# Altium schematic symbol library Sang_library.SchLib: 1607 symbols (part 2 of 15)
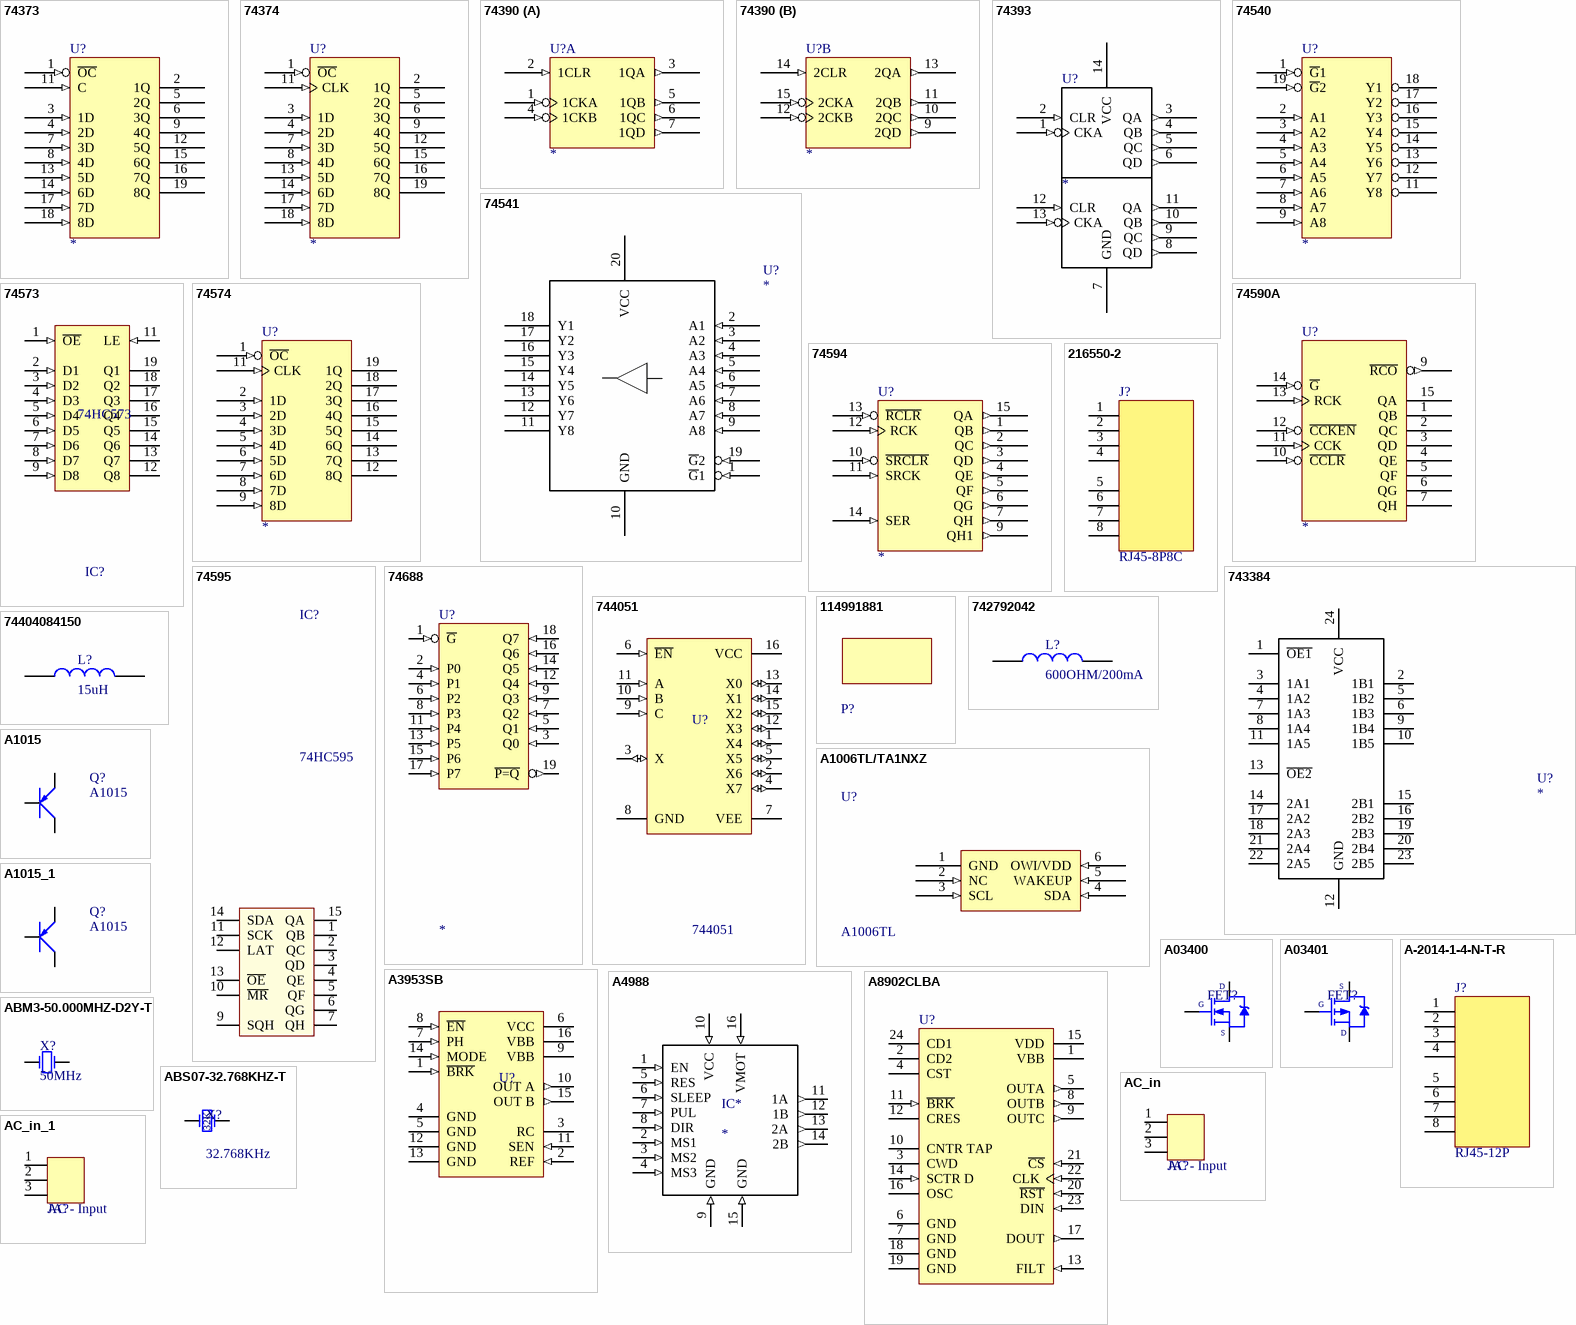
[diagram p99: symbols 74373 to AC_in_1]

## 743384
designator U?
74CB3T3384 LEVEL SHIFTING BUFFER
footprint SO24
pins: 1 ~{OE1}, 2 1B1, 3 1A1, 4 1A2, 5 1B2, 6 1B3, 7 1A3, 8 1A4, 9 1B4, 10 1B5, 11 1A5, 12 GND, 13 ~{OE2}, 14 2A1, 15 2B1, 16 2B2, 17 2A2, 18 2A3, 19 2B3, 20 2B4, 21 2A4, 22 2A5, 23 2B5, 24 VCC

## 744051
designator U?
Analog Multiplexer/Demultiplexer; Published: 17-Jul-2002; LatestRevisionDate: 06-Jun-2005; LatestRevisionNote: Stylized 3D Model Added; DatasheetVersion: Mar-2000; PackageReference: 648-08; Publisher: Altium Limited; PackageDescription: DIP; 16 Leads; Row Spacing 7.62 mm; Pitch 2.54 mm; Code_JEDEC: MS-001-BB; ComponentLink1Description: Manufacturer Link; ComponentLink1URL: http://www.onsemi.com/site/products/parametrics/0,4446,47,00.html; ComponentLink2Description: Datasheet; ComponentLink2URL: http://www.onsemi.com/pub/Collateral/MC74HC4051A-D.PDF
footprint DIP16
footprint SO16
pins: 1 X4 (io), 2 X6 (io), 3 X (io), 4 X7 (io), 5 X5 (io), 6 ~{EN} (in), 7 VEE (power), 8 GND (power), 9 C (in), 10 B (in), 11 A (in), 12 X3 (io), 13 X0 (io), 14 X1 (io), 15 X2 (io), 16 VCC (power)

## 114991881
designator P?  (value not drawn)
OV2640 FISHEYE CAMERA; MFR: Seeed Technology Co., Ltd; Value: 114991881; MPN: 114991881; MFR_URL: *
footprint SEEED_OV2640_CAM (Footprint not found)

## 742792042
designator L?, comment 600OHM/200mA
IND-FERRITE BEAD 600 OHM 1LN 0805; MPN: 742792042; CompanyID: VT-01115; Solder: SMT; Value: 600OHM/200mA; Category: FERRITE BEAD; PinCount: 2
footprint IND-0805 (2012) (Resistor, Chip; 2.00 mm L X 1.25 mm W X 0.70 mm H body)
pins: 1, 2

## 74404084150
designator L?, comment 15uH
FIXED IND 15UH 2.6A 47 MOHM SMD; MPN: 74404084150; MFR: Würth Elektronik; Solder: SMT; Value: 15uH; Category: INDUCTOR; PinCount: 2
footprint IND-8x8mm
pins: 1, 2

## A1006TL/TA1NXZ
designator U?, comment A1006TL
IC SECURE AUTHENTICATOR 6HXSON; MPN: A1006TL/TA1NXZ; MFR: NXP USA Inc.; Solder: SMT; Value: A1006TL; Category: IC; PinCount: 6
footprint 6-HXSON (SON, 6-Leads, Body 2.00x2.00mm, Pitch 0.65mm, Thermal Pad 1.60x1.00mm, IPC Medium Density)
pins: 1 GND, 2 NC (in), 3 SCL (in), 4 SDA (in), 5 WAKEUP (in), 6 OWI/VDD (in)

## A1015
designator Q?
Dán; Ten_Linh_Kien: A1015 SOT23 TRANS PNP 0.15A 50V ( SMD-BA); Don_Vi: Con; Ma_Hang: MH001957; Ghi_Chu: *; Kieu_Chan: *; Chung_Loai: Dán
footprint QTO-92 (TO-92)
footprint SOT23B (SOT 23B)
pins: 1 B, 2 C, 3 E

## A1015_1
designator Q?, comment A1015
Dán; Ten_Linh_Kien: A1015 SOT23 TRANS PNP 0.15A 50V ( SMD-BA); Don_Vi: Con; Ma_Hang: MH001957; Ghi_Chu: *; Kieu_Chan: *; Chung_Loai: Dán
footprint QTO-92 (TO-92)
footprint SOT23B (SOT 23B)
pins: 1 B, 2 C, 3 E

## A03400
designator FET?  (value not drawn)
N-MOS 30V 5.8A
footprint SOT23-123 (SOT23, 1=bottom-left, 2=top, 3=bottom-right)
pins: 1 G, 2 D, 3 S

## A03401
designator FET?  (value not drawn)
P-MOS 30V 4A
footprint SOT23-123 (SOT23, 1=bottom-left, 2=top, 3=bottom-right)
pins: 1 G, 2 D, 3 S

## A3953SB
designator U?
Full-Bridge PWM Motor Driver; Note: Pins (4,5) and (12,13) exist as TABS; all are internally connected (GND).; Published: 13-Oct-2000; LatestRevisionDate: 06-Jun-2005; LatestRevisionNote: Stylized 3D Model Added.; DatasheetVersion: 1995; PackageVersion: 1994; PackageReference: B16; Publisher: Altium Limited; PackageDescription: DIP; 16 Leads; Row Spacing 7.62 mm; Pitch 2.54 mm; Code_JEDEC: MS-001-BB; ComponentLink1Description: Manufacturer Link; ComponentLink1URL: http://www.allegromicro.com/; ComponentLink2Description: Datasheet; ComponentLink2URL: http://www.allegromicro.com/sf/3953/
footprint DIP16
footprint SO16L (SOIC, 16-Leads, Body 10.30x7.50mm, Pitch 1.27mm, IPC Medium Density)
pins: 1 ~{BRK} (in), 2 REF (in), 3 RC, 4 GND (power), 5 GND (power), 6 VCC (power), 7 PH (in), 8 ~{EN} (in), 9 VBB (power), 10 OUT A (out), 11 SEN (in), 12 GND (power), 13 GND (power), 14 MODE (in), 15 OUT B (out), 16 VBB (power)

## A4988
designator IC*
footprint A4988
footprint A4988
pins: 1 EN (in), 2 MS1 (in), 3 MS2 (in), 4 MS3 (in), 5 RES (in), 6 SLEEP (in), 7 PUL (in), 8 DIR (in), 9 GND (in), 10 VCC (in), 11 1A (out), 12 1B (out), 13 2A (out), 14 2B (out), 15 GND (in), 16 VMOT (in)

## A8902CLBA
designator U?
3-Phase Brushless DC Motor Controller/Driver with Back-EMF Sensing; Note: Pins (6,7) and (18,19) exist as TABS; all are internally connected (GND).; ComponentAvailability: Obsolete; Published: 13-Oct-2000; LatestRevisionDate: 13-Apr-2006; LatestRevisionNote: IPC-7351 Footprint Added.; DatasheetVersion: 1995; PackageVersion: 1995; PackageReference: LB24; Publisher: Altium Limited; PackageDescription: 24-Pin Small Outline Integrated Circuit 1.27 mm Pitch; ComponentLink1Description: Manufacturer Link; ComponentLink1URL: http://www.allegromicro.com/; ComponentLink2Description: Datasheet; ComponentLink2URL: http://www.allegromicro.com/datafile/archive/89027.pdf
footprint SO24 (SOIC, 24-Leads, Body 15.30x7.50mm, Pitch 1.27mm, IPC Medium Density)
pins: 1 VBB (power), 2 CD2, 3 CWD, 4 CST, 5 OUTA (out), 6 GND (power), 7 GND (power), 8 OUTB (out), 9 OUTC (out), 10 CNTR TAP, 11 ~{BRK} (in), 12 CRES, 13 FILT (in), 14 SCTR D (in), 15 VDD (power), 16 OSC, 17 DOUT (out), 18 GND (power), 19 GND (power), 20 ~{RST} (in), 21 ~{CS} (in), 22 CLK (in), 23 DIN (in), 24 CD1

## A-2014-1-4-N-T-R
designator J?, comment RJ45-12P
Solder: WAVE
footprint A-2014-1-4-N-T-R (Footprint not found)
pins: 1, 2, 3, 4, 5, 6, 7, 8

## ABM3-50.000MHZ-D2Y-T
designator X?, comment 50MHz
CRYSTAL 50.0000MHZ 18pF SMD; MPN: ABM3-50.000MHZ-D2Y-T; MFR: Abracon LLC; Solder: SMT; Value: 50MHz; Category: CRYSTAL
footprint CRYSTAL_ABM3 5x3.2mm (Crystal 5x3.2mm)
pins: 1 OSC1, 2 OSC2

## ABS07-32.768KHZ-T
designator X?, comment 32.768KHz
CRYSTAL 32.7680KHZ 12.5pF SMD; MPN: ABS07-32.768KHZ-T; Solder: SMT; CompanyID: VT-01153; Value: 32.768KHz; Category: CRYSTAL
footprint Crystal_ABS07_SMD-3.2x1.5MM
pins: 1 OSC1, 2 OSC2
text: 32K

## AC_in
designator JA?, comment AC - Input
Value: AC - Input
footprint AC_IN (AC_Input)
pins: 1, 2, 3

## AC_in_1
designator JA?, comment AC - Input
Value: AC - Input
footprint AC_IN (AC_Input)
pins: 1, 2, 3

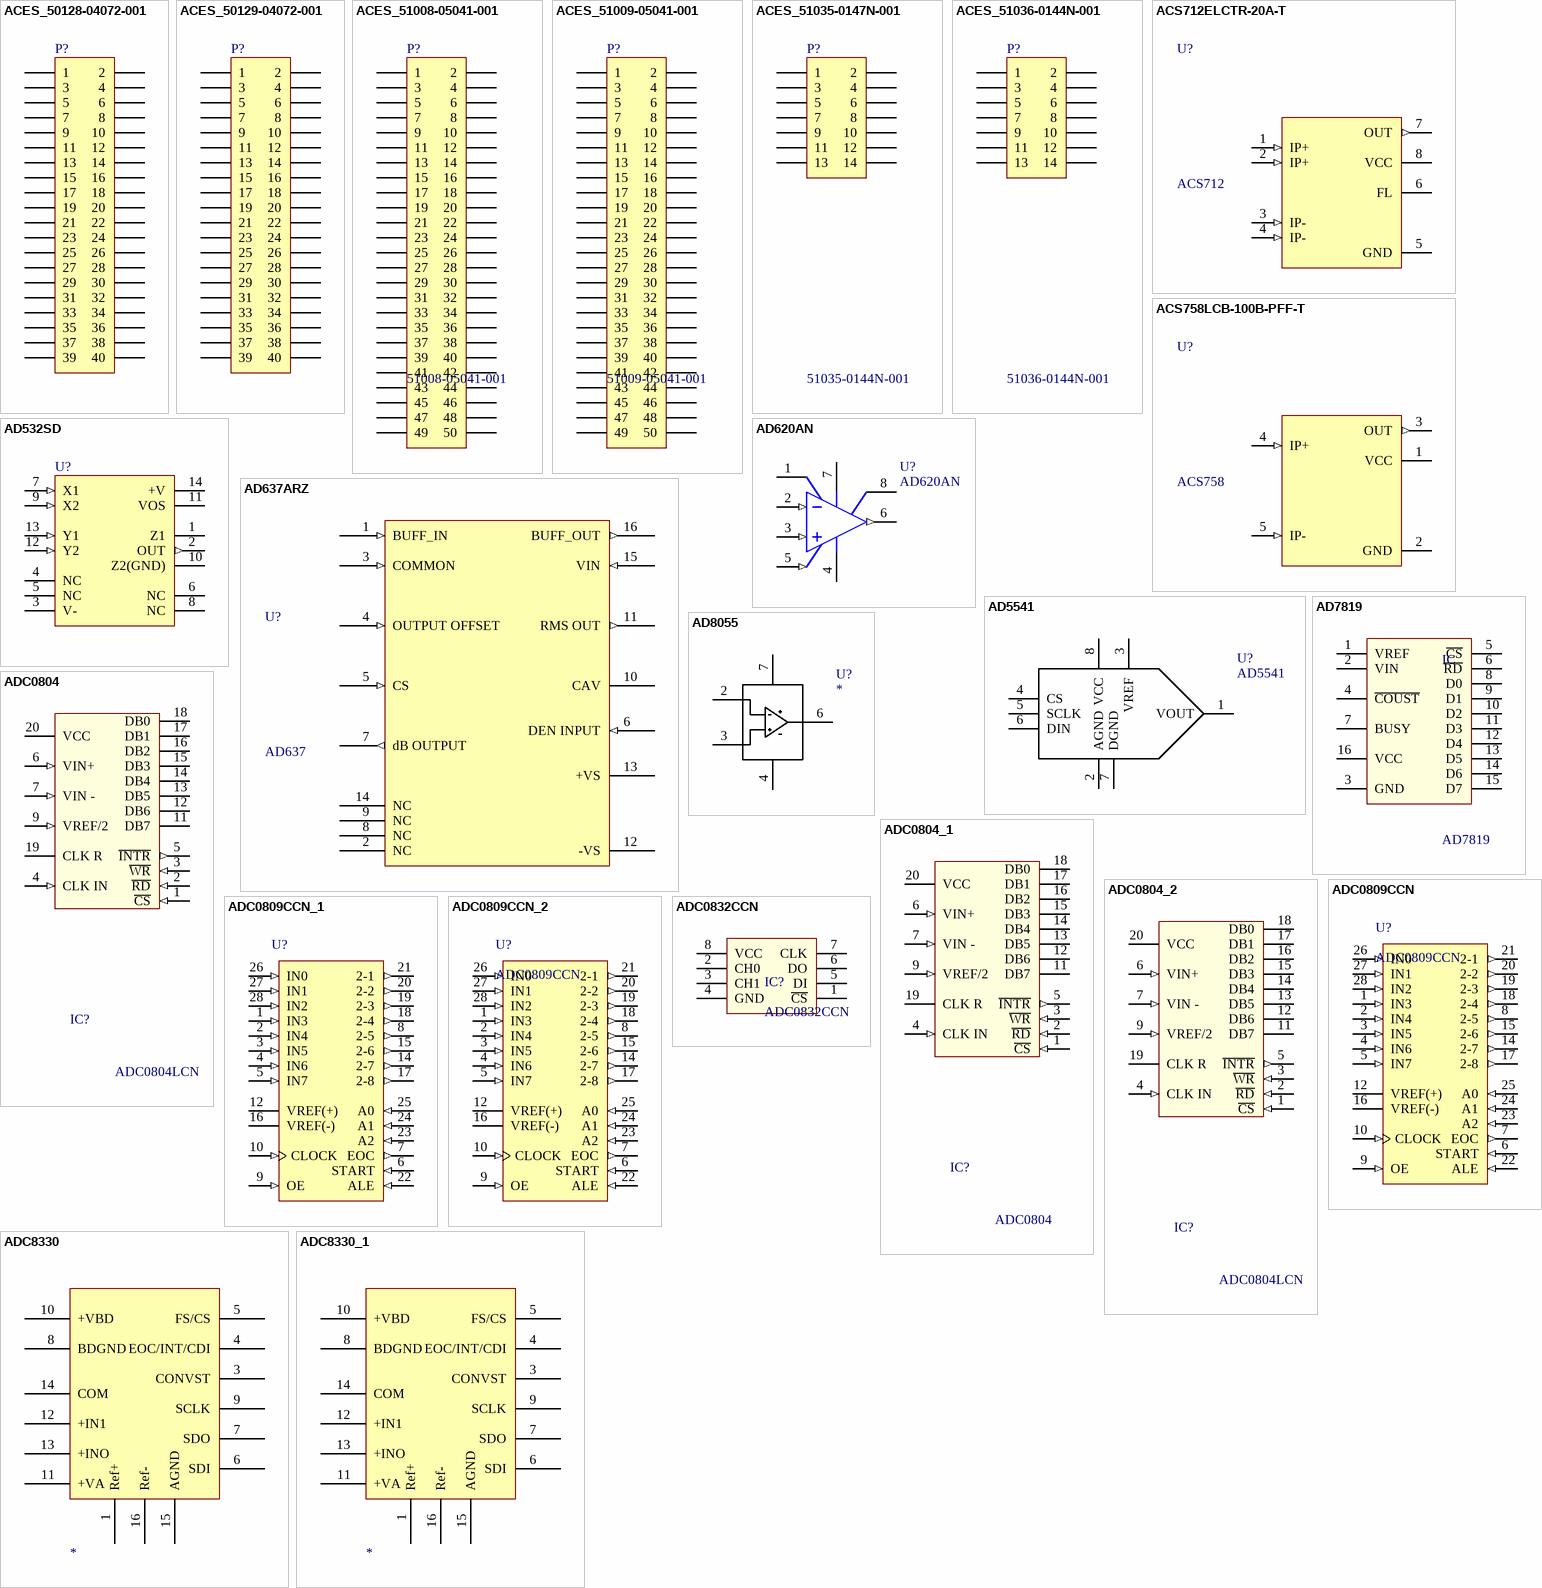
[diagram p7: symbols ACES_50128-04072-001 to ADC8330_1]

## ACES_50128-04072-001
designator P?
50128-04072-001 Dual Row, 40 pin, MALE; MFR: ACES; Solder: SMT; MPN: 50128-04072-001; Value: 50128-04072-001
footprint ACES_50128-04072-001 (Footprint not found)
signal-integrity model Connector
pins: 1, 2, 3, 4, 5, 6, 7, 8, 9, 10, 11, 12, 13, 14, 15, 16, 17, 18, 19, 20, 21, 22, 23, 24, 25, 26, 27, 28, 29, 30, 31, 32, 33, 34, 35, 36, 37, 38, 39, 40

## ACES_50129-04072-001
designator P?
50129-04072-001 Dual Row, 40 pin, FEMALE; MFR: ACES; Solder: SMT; MPN: 50129-04072-001; Value: 50129-04072-001
footprint ACES_50129-04072-001 (Footprint not found)
signal-integrity model Connector
pins: 1, 2, 3, 4, 5, 6, 7, 8, 9, 10, 11, 12, 13, 14, 15, 16, 17, 18, 19, 20, 21, 22, 23, 24, 25, 26, 27, 28, 29, 30, 31, 32, 33, 34, 35, 36, 37, 38, 39, 40

## ACES_51008-05041-001
designator P?, comment 51008-05041-001
51008-05041-001 Dual Row, 50 pin, MALE; MFR: ACES; MPN: ACES_51008-05041-001; Solder: SMT; Value: ACES_51008-05041-001; MPN2: 10132798-052100LF; MFR2: Amphenol ICC (FCI)
footprint ACES_51008-05041-001 (Footprint not found)
signal-integrity model Connector
pins: 1, 2, 3, 4, 5, 6, 7, 8, 9, 10, 11, 12, 13, 14, 15, 16, 17, 18, 19, 20, 21, 22, 23, 24, 25, 26, 27, 28, 29, 30, 31, 32, 33, 34, 35, 36, 37, 38, 39, 40, 41, 42, 43, 44, 45, 46, 47, 48, 49, 50

## ACES_51009-05041-001
designator P?, comment 51009-05041-001
51009-05041-001 Dual Row, 50 pin, FEMALE; MFR: ACES; MPN: ACES_51009-05041-001; Solder: SMT; MPN2: 10132797-055100LF; MFR2: Amphenol ICC (FCI)
footprint ACES_51009-05041-001
signal-integrity model Connector
pins: 1, 2, 3, 4, 5, 6, 7, 8, 9, 10, 11, 12, 13, 14, 15, 16, 17, 18, 19, 20, 21, 22, 23, 24, 25, 26, 27, 28, 29, 30, 31, 32, 33, 34, 35, 36, 37, 38, 39, 40, 41, 42, 43, 44, 45, 46, 47, 48, 49, 50

## ACES_51035-0147N-001
designator P?, comment 51035-0144N-001
51035-0147N-001 Dual Row, 14 pin, MALE; MFR: ACES; Solder: SMT; MPN: 51035-0147N-001; Value: 51035-0147N-001
footprint ACES_51035-0147N-001 (Footprint not found)
signal-integrity model Connector
pins: 1, 2, 3, 4, 5, 6, 7, 8, 9, 10, 11, 12, 13, 14

## ACES_51036-0144N-001
designator P?, comment 51036-0144N-001
51036-0144N-001 Dual Row, 14 pin, FEMALE; MFR: ACES; Solder: SMT; MPN: 51036-0144N-001; Value: 51036-0144N-001
footprint ACES_51036-0144N-001 (Footprint not found)
signal-integrity model Connector
pins: 1, 2, 3, 4, 5, 6, 7, 8, 9, 10, 11, 12, 13, 14

## ACS712ELCTR-20A-T
designator U?, comment ACS712
SENSOR CURRENT HALL 20A AC/DC; MPN: ACS712ELCTR-20A-T; MFR: Allegro; Solder: SMT; Value: ACS712; Category: IC; PinCount: 8
footprint SOIC-8
pins: 1 IP+ (in), 2 IP+ (in), 3 IP- (in), 4 IP- (in), 5 GND, 6 FL, 7 OUT (out), 8 VCC

## ACS758LCB-100B-PFF-T
designator U?, comment ACS758
SENSOR CURRENT HALL 100A AC/DC; MPN: ACS758LCB-100B-PFF-T; MFR: Allegro MicroSystems; Solder: SMT; Value: ACS758; Category: IC; PinCount: 5
footprint ACS758LCB (Footprint not found)
pins: 1 VCC, 2 GND, 3 OUT (out), 4 IP+ (in), 5 IP- (in)

## AD532SD
designator U?
Internally Trimmed IC Multiplier; Note: Pins 4, 5, 6 and 8 are not connected; Published: 8-Jun-2000; LatestRevisionDate: 04-Mar-2005; LatestRevisionNote: Stylized 3D Model Added.; DatasheetVersion: REV.A 1996; PackageReference: D-14; Publisher: Altium Limited; PackageDescription: DIP; 14 Leads; Row Spacing 7.62 mm; Pitch 2.54 mm; ComponentLink1Description: Manufacturer Link; ComponentLink1URL: http://www.analog.com/en/prod/0%2C2877%2CAD532%2C00.html; ComponentLink2Description: Datasheet; ComponentLink2URL: http://www.analog.com/UploadedFiles/Data_Sheets/417213471AD532_c.pdf
footprint DIP14
pins: 1 Z1, 2 OUT (out), 3 V- (power), 4 NC, 5 NC, 6 NC, 7 X1 (in), 8 NC, 9 X2 (in), 10 Z2(GND), 11 VOS, 12 Y2 (in), 13 Y1 (in), 14 +V (power)

## AD620AN
designator U?
Low-Cost, Low-Power Instrumentation Amplifier; Published: 8-Jun-2000; LatestRevisionDate: 04-Mar-2005; LatestRevisionNote: Stylized 3D Model Added.; DatasheetVersion: REV.D 1998; PackageVersion: revA; PackageReference: N-8; Publisher: Altium Limited; PackageDescription: DIP; 8 Leads; Row Spacing 7.62 mm; Pitch 2.54 mm; ComponentLink1Description: Manufacturer Link; ComponentLink1URL: http://www.analog.com/en/prod/0%2C2877%2CAD620%2C00.html; ComponentLink2Description: Datasheet; ComponentLink2URL: http://www.analog.com/UploadedFiles/Data_Sheets/897653854AD620_g.pdf
footprint DIP8
footprint SO8 (SOIC, 8-Leads, Body 4.9x3.9mm, Pitch 1.27mm, IPC High Density)
pins: 1 RG, 2 -IN (in), 3 +IN (in), 4 V- (power), 5 REF (in), 6 OUT (out), 7 V+ (power), 8 RG

## AD637ARZ
designator U?, comment AD637
IC RMS TO DC CONVERTER 16SOIC; MPN: AD637ARZ; MFR: Analog Devices Inc.; Solder: SMT; Value: AD637; Category: IC; PinCount: 16
footprint DW16_N (SOIC, 16-Leads, Body 10.3x7.5mm, Pitch 1.27mm, IPC Medium Density)
pins: 1 BUFF_IN (in), 2 NC, 3 COMMON (in), 4 OUTPUT OFFSET (in), 5 CS (in), 6 DEN INPUT (in), 7 dB OUTPUT (out), 8 NC, 9 NC, 10 CAV, 11 RMS OUT (out), 12 -VS (power), 13 +VS (power), 14 NC, 15 VIN (in), 16 BUFF_OUT (out)

## AD5541
designator U?
16 BIT D/A CONVERTOR; Manufacturer Part Number: AD5541JRZ; Manufacturer: Analog Devices Inc; Settling Time: 1µs; Voltage Supply Source: Single Supply; Data Interface: Serial; Number of Bits: 16; Power Dissipation (Max): 6.05mW; Number of Converters: 1; Number of Outputs and Type: 1 Voltage, Unipolar; 1 Voltage, Bipolar; Supplier 1: Digi-Key; Supplier Part Number 1: AD5541JRZ-ND; RoHS: RoHS Compliant; Supplier Part Number: AD5541JRZ-ND; Supplier: Digi-Key; Operating Temperature: 0°C ~ 70°C; Category: Integrated Circuits (ICs); Packaging: Tube; Package / Case: 8-SOIC (3.9mm Width)
footprint DIP8
footprint SO8 (SOIC, 8-Leads, Body 4.9x3.9mm, Pitch 1.27mm, IPC High Density)
pins: 1 VOUT, 2 AGND, 3 VREF, 4 CS, 5 SCLK, 6 DIN, 7 DGND, 8 VCC

## AD7819
designator IC
8 bit A/D  Converter; Value: AD7819
footprint DIP16
footprint SO16 (SOIC, 16-Leads, Body 9.90x3.91mm, Pitch 1.27mm, IPC Medium Density)
pins: 1 VREF, 2 VIN, 3 GND, 4 ~{COUST}, 5 ~{CS}, 6 ~{RD}, 7 BUSY, 8 D0, 9 D1, 10 D2, 11 D3, 12 D4, 13 D5, 14 D6, 15 D7, 16 VCC

## AD8055
designator U?
OPAMP; Manufacturer Part Number: AD8055AR; Manufacturer: Analog Devices Inc; Text Field1: ST; Text Field2: LM2903DT; Text Field3: Avnet; Text Field5: SO8; Text Field6: 0.078; Amplifier Type: Voltage Feedback; Voltage - Input Offset: 3000µV; Current - Output / Channel: 60mA; Current - Supply: 5.4mA; Voltage - Supply, Single/Dual (±): 8 V ~ 12 V, ±4 V ~ 6 V; Number of Circuits: 1; Slew Rate: 1400 V/µs; Current - Input Bias: 400nA; Text Field4: LM2903DT; NI?: *; O?: *; Section:: *; Supplier 1: Digi-Key; Supplier Part Number 1: AD8055AR-ND; Category: Integrated Circuits (ICs); RoHS: RoHS non-compliant; Gain Bandwidth Product: -; Supplier Part Number: AD8055AR-ND; Output Type: -; Operating Temperature: -40°C ~ 125°C; Supplier: Digi-Key; Package / Case: 8-SOIC (3.9mm Width); Packaging: Tube
footprint SO8 (SOIC, 8-Leads, Body 4.9x3.9mm, Pitch 1.27mm, IPC High Density)
footprint DIP8
pins: 2, 3, 4, 6, 7

## ADC0804
designator IC?, comment ADC0804LCN
Cắm; Ten_Linh_Kien: ADC0804LCN DIP20; Don_Vi: Con; Ma_Hang: MH002626; Ghi_Chu: *; Kieu_Chan: *; Chung_Loai: Cắm
footprint DIP20/W0.3 (DIP 20, 20 PIN, W 300mil, Pin to pin 100mil)
pins: 1 ~{CS} (in), 2 ~{RD} (in), 3 ~{WR} (in), 4 CLK IN (in), 5 ~{INTR} (out), 6 VIN+ (in), 7 VIN - (in), 8 AGND (power) hidden to GND, 9 VREF/2 (in), 10 DGND (power) hidden to GND, 11 DB7 (hiz), 12 DB6 (hiz), 13 DB5 (hiz), 14 DB4 (hiz), 15 DB3 (hiz), 16 DB2 (hiz), 17 DB1 (hiz), 18 DB0 (hiz), 19 CLK R, 20 VCC (power)

## ADC0804_1
designator IC?, comment ADC0804
8-Bit A/D Converter (01-05); Value: ADC0804
footprint DIP20 (DIP 20, 20 PIN, W 300mil, Pin to pin 100mil)
footprint SO20 (SOIC, 20-Leads, Body 12.60x7.50mm, Pitch 1.27mm, IPC Medium Density)
pins: 1 ~{CS} (in), 2 ~{RD} (in), 3 ~{WR} (in), 4 CLK IN (in), 5 ~{INTR} (out), 6 VIN+ (in), 7 VIN - (in), 8 AGND (power) hidden to GND, 9 VREF/2 (in), 10 DGND (power) hidden to GND, 11 DB7 (hiz), 12 DB6 (hiz), 13 DB5 (hiz), 14 DB4 (hiz), 15 DB3 (hiz), 16 DB2 (hiz), 17 DB1 (hiz), 18 DB0 (hiz), 19 CLK R, 20 VCC (power)

## ADC0804_2
designator IC?, comment ADC0804LCN
Cắm; Ten_Linh_Kien: ADC0804LCN DIP20; Don_Vi: Con; Ma_Hang: MH002626; Ghi_Chu: *; Kieu_Chan: *; Chung_Loai: Cắm
footprint DIP20/W0.3 (DIP 20, 20 PIN, W 300mil, Pin to pin 100mil)
pins: 1 ~{CS} (in), 2 ~{RD} (in), 3 ~{WR} (in), 4 CLK IN (in), 5 ~{INTR} (out), 6 VIN+ (in), 7 VIN - (in), 8 AGND (power) hidden to GND, 9 VREF/2 (in), 10 DGND (power) hidden to GND, 11 DB7 (hiz), 12 DB6 (hiz), 13 DB5 (hiz), 14 DB4 (hiz), 15 DB3 (hiz), 16 DB2 (hiz), 17 DB1 (hiz), 18 DB0 (hiz), 19 CLK R, 20 VCC (power)

## ADC0809CCN
designator U?
Cắm; Ten_Linh_Kien: ADC0809CCN DIP28; Don_Vi: Con; Ma_Hang: MH002543; Ghi_Chu: *; Kieu_Chan: *; Chung_Loai: Cắm
footprint DIP28/W0.6 (DIP28/W.600, Pin to pin 100mil)
pins: 1 IN3 (in), 2 IN4 (in), 3 IN5 (in), 4 IN6 (in), 5 IN7 (in), 6 START (in), 7 EOC (out), 8 2-5 (out), 9 OE (in), 10 CLOCK (in), 11 VCC (power) hidden to VCC, 12 VREF(+) (power), 13 GND (power) hidden to GND, 14 2-7 (out), 15 2-6 (out), 16 VREF(-) (power), 17 2-8 (out), 18 2-4 (out), 19 2-3 (out), 20 2-2 (out), 21 2-1 (out), 22 ALE (in), 23 A2 (in), 24 A1 (in), 25 A0 (in), 26 IN0 (in), 27 IN1 (in), 28 IN2 (in)

## ADC0809CCN_1
designator U?
8-bit Microprocessor Compatible A/D Converters With 8-Channel Multiplexer; PartNumber: ADC0809CCN; Manufacturer: National Semiconductor; CompType: ADC IC; PackageTopMarking: NSUZXYYTTE#*ADC0809CCN; Published: 27-Nov-2008; DatasheetVersion: Sep-1992; PackageVersion: revB, Aug-1993; PackageReference: NA28E; Publisher: Altium Limited; PackageDescription: Molded Dip, 28 Lead, .600 Centers, Substractor Package; RoHS: O; PinCount: 28; DigiKeyPartNumber: ADC0809CCN-ND; ComponentLink1Description: ADC0809 Datasheet; ComponentLink1URL: http://www.national.com/ds/AD/ADC0809.pdf; ComponentLink2Description: ADC0809 Web Page; ComponentLink2URL: http://www.national.com/pf/AD/ADC0809.html; ComponentLink3Description: NA28E Package Page; ComponentLink3URL: http://www.national.com/packaging/folders/na28e.html
footprint DIP28/W0.6 (DIP28/W.600, Pin to pin 100mil)
pins: 1 IN3 (in), 2 IN4 (in), 3 IN5 (in), 4 IN6 (in), 5 IN7 (in), 6 START (in), 7 EOC (out), 8 2-5 (out), 9 OE (in), 10 CLOCK (in), 11 VCC (power) hidden to VCC, 12 VREF(+) (power), 13 GND (power) hidden to GND, 14 2-7 (out), 15 2-6 (out), 16 VREF(-) (power), 17 2-8 (out), 18 2-4 (out), 19 2-3 (out), 20 2-2 (out), 21 2-1 (out), 22 ALE (in), 23 A2 (in), 24 A1 (in), 25 A0 (in), 26 IN0 (in), 27 IN1 (in), 28 IN2 (in)

## ADC0809CCN_2
designator U?, comment ADC0809CCN
Cắm; Ten_Linh_Kien: ADC0809CCN DIP28; Don_Vi: Con; Ma_Hang: MH002543; Ghi_Chu: *; Kieu_Chan: *; Chung_Loai: Cắm
footprint DIP28/W0.6 (DIP28/W.600, Pin to pin 100mil)
pins: 1 IN3 (in), 2 IN4 (in), 3 IN5 (in), 4 IN6 (in), 5 IN7 (in), 6 START (in), 7 EOC (out), 8 2-5 (out), 9 OE (in), 10 CLOCK (in), 11 VCC (power) hidden to VCC, 12 VREF(+) (power), 13 GND (power) hidden to GND, 14 2-7 (out), 15 2-6 (out), 16 VREF(-) (power), 17 2-8 (out), 18 2-4 (out), 19 2-3 (out), 20 2-2 (out), 21 2-1 (out), 22 ALE (in), 23 A2 (in), 24 A1 (in), 25 A0 (in), 26 IN0 (in), 27 IN1 (in), 28 IN2 (in)

## ADC0832CCN
designator IC?
Dual 8-Bit Serial I/O A/D Converters
footprint DIP8
footprint SO8 (SOIC, 8-Leads, Body 4.9x3.9mm, Pitch 1.27mm, IPC High Density)
pins: 1 ~{CS}, 2 CH0, 3 CH1, 4 GND, 5 DI, 6 DO, 7 CLK, 8 VCC

## ADC8330
designator ?
pins: 1 Ref+, 2 NC hidden to NC, 3 CONVST, 4 EOC/INT/CDI, 5 FS/CS, 6 SDI, 7 SDO, 8 BDGND, 9 SCLK, 10 +VBD, 11 +VA, 12 +IN1, 13 +INO, 14 COM, 15 AGND, 16 Ref-

## ADC8330_1
designator ?
pins: 1 Ref+, 2 NC hidden to NC, 3 CONVST, 4 EOC/INT/CDI, 5 FS/CS, 6 SDI, 7 SDO, 8 BDGND, 9 SCLK, 10 +VBD, 11 +VA, 12 +IN1, 13 +INO, 14 COM, 15 AGND, 16 Ref-

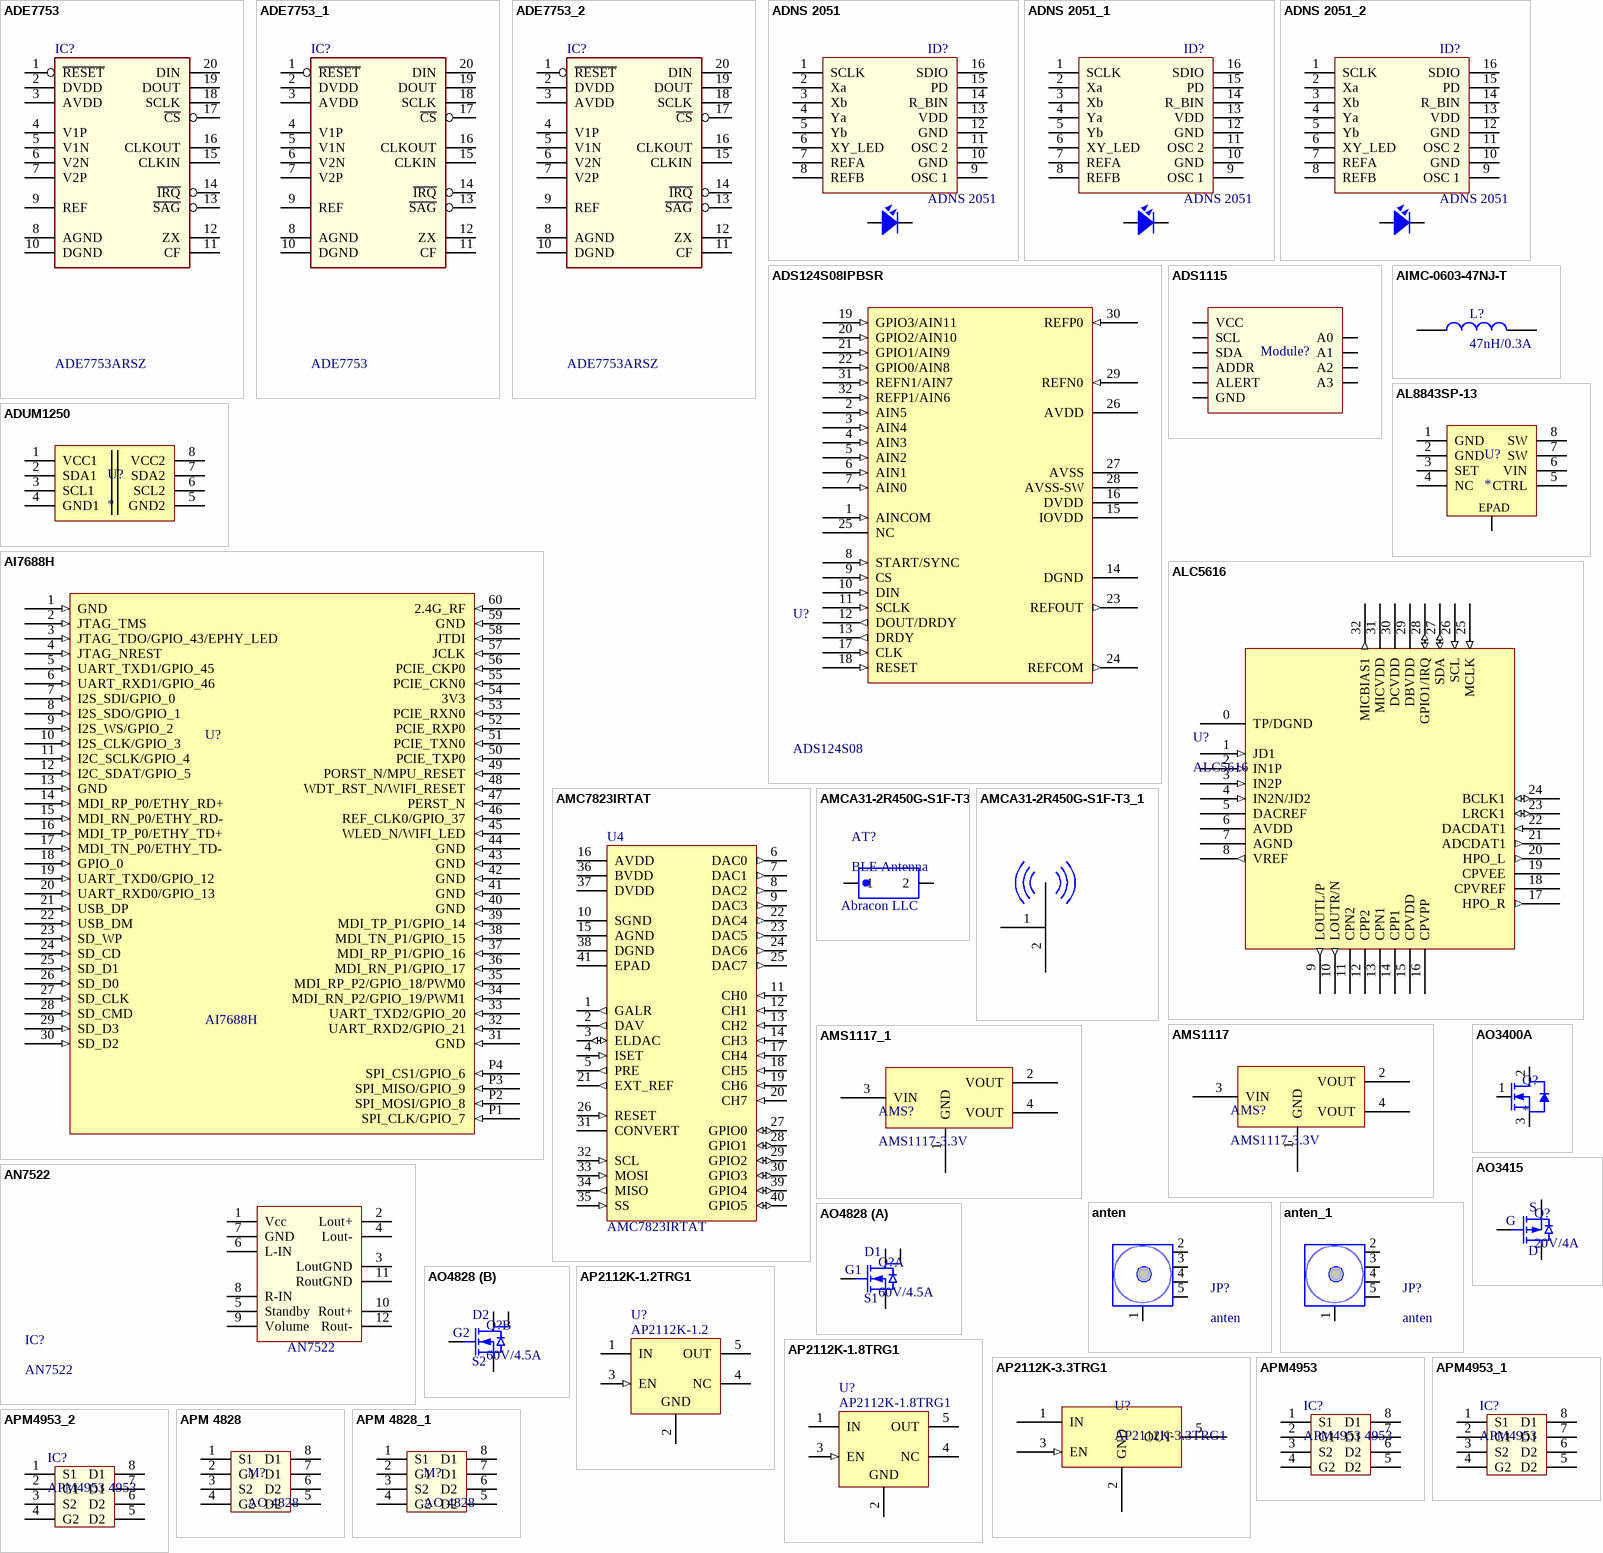
[diagram p8: symbols ADE7753 to APM 4828_1]

## ADE7753
designator IC?, comment ADE7753ARSZ
Dán; Ten_Linh_Kien: ADE7753ARSZ SSOP20; Don_Vi: Con; Ma_Hang: MH004179; Ghi_Chu: *; Kieu_Chan: *; Chung_Loai: Dán
footprint TSOP65-20BN (TSOP, 20-Leads, Body 6.5x4.4mm, Pitch 0.65mm, IPC Medium Density)
pins: 1 ~{RESET}, 2 DVDD, 3 AVDD, 4 V1P, 5 V1N, 6 V2N, 7 V2P, 8 AGND, 9 REF, 10 DGND, 11 CF, 12 ZX, 13 ~{SAG}, 14 ~{IRQ}, 15 CLKIN, 16 CLKOUT, 17 ~{CS}, 18 SCLK, 19 DOUT, 20 DIN

## ADE7753_1
designator IC?, comment ADE7753
Single-Phase Multifunction Metering IC with di/dt Sensor Interface
footprint TSOP20 (TSOP, 20-Leads, Body 7.20x5.30mm, Pitch 0.65mm, IPC High Density)
pins: 1 ~{RESET}, 2 DVDD, 3 AVDD, 4 V1P, 5 V1N, 6 V2N, 7 V2P, 8 AGND, 9 REF, 10 DGND, 11 CF, 12 ZX, 13 ~{SAG}, 14 ~{IRQ}, 15 CLKIN, 16 CLKOUT, 17 ~{CS}, 18 SCLK, 19 DOUT, 20 DIN

## ADE7753_2
designator IC?, comment ADE7753ARSZ
Dán; Ten_Linh_Kien: ADE7753ARSZ SSOP20; Don_Vi: Con; Ma_Hang: MH004179; Ghi_Chu: *; Kieu_Chan: *; Chung_Loai: Dán
footprint TSOP65-20BN (TSOP, 20-Leads, Body 6.5x4.4mm, Pitch 0.65mm, IPC Medium Density)
pins: 1 ~{RESET}, 2 DVDD, 3 AVDD, 4 V1P, 5 V1N, 6 V2N, 7 V2P, 8 AGND, 9 REF, 10 DGND, 11 CF, 12 ZX, 13 ~{SAG}, 14 ~{IRQ}, 15 CLKIN, 16 CLKOUT, 17 ~{CS}, 18 SCLK, 19 DOUT, 20 DIN

## ADNS 2051
designator ID?
MOUSE; Value: ADNS 2051
footprint ADNS 2051 (Footprint not found)
pins: 1 SCLK, 2 Xa, 3 Xb, 4 Ya, 5 Yb, 6 XY_LED, 7 REFA, 8 REFB, 9 OSC 1, 10 GND, 11 OSC 2, 12 GND, 13 VDD, 14 R_BIN, 15 PD, 16 SDIO, H1 A hidden, H2 A hidden, L1 A, L2 K

## ADNS 2051_1
designator ID?, comment ADNS 2051
MOUSE; Value: ADNS 2051
footprint ADNS 2051 (Footprint not found)
pins: 1 SCLK, 2 Xa, 3 Xb, 4 Ya, 5 Yb, 6 XY_LED, 7 REFA, 8 REFB, 9 OSC 1, 10 GND, 11 OSC 2, 12 GND, 13 VDD, 14 R_BIN, 15 PD, 16 SDIO, H1 A hidden, H2 A hidden, L1 A, L2 K

## ADNS 2051_2
designator ID?, comment ADNS 2051
MOUSE; Value: ADNS 2051
footprint ADNS 2051 (Footprint not found)
pins: 1 SCLK, 2 Xa, 3 Xb, 4 Ya, 5 Yb, 6 XY_LED, 7 REFA, 8 REFB, 9 OSC 1, 10 GND, 11 OSC 2, 12 GND, 13 VDD, 14 R_BIN, 15 PD, 16 SDIO, H1 A hidden, H2 A hidden, L1 A, L2 K

## ADS124S08IPBSR
designator U?, comment ADS124S08
IC ADC 24BIT SIGMA-DELTA 32LQFP; MPN: ADS124S08IPBSR; MFR: Texas Instruments; Solder: SMT; Value: ADS124S08; Category: IC
footprint TSQFP50P700X700X120-32N (TSQFP, 32-Leads, Body 5.00x5.00mm, Pitch 0.50mm, IPC Medium Density)
pins: 1 AINCOM (in) "Common analog input for single-ended measurements", 2 AIN5 (in) "Analog input 5", 3 AIN4 (in) "Analog input 4", 4 AIN3 (in) "Analog input 3", 5 AIN2 (in) "Analog input 2", 6 AIN1 (in) "Analog input 1", 7 AIN0 (in) "Analog input 0", 8 START/SYNC (in) "Start conversion", 9 CS (in) "Chip select; active low", 10 DIN (in) "Serial data input", 11 SCLK (in) "Serial clock input", 12 DOUT/DRDY (out) "Serial data output combined with data ready; active low", 13 DRDY (out) "Data ready; active low", 14 DGND (power) "Digital ground", 15 IOVDD (power) "Digital I/O power supply.", 16 DVDD (power) "Digital core power supply. Connect a 100-nF (or larger) capacitor to DGND.", 17 CLK (in) "External clock input. Connect to DGND to use the internal oscillator.", 18 RESET (in) "Reset; active low", 19 GPIO3/AIN11 (in) "General-purpose I/O(2); analog input 11 (ADS124S08 only)", 20 GPIO2/AIN10 (in) "General-purpose I/O(2); analog input 10 (ADS124S08 only)", 21 GPIO1/AIN9 (in) "General-purpose I/O(2); analog input 9 (ADS124S08 only)", 22 GPIO0/AIN8 (in) "General-purpose I/O(2); analog input 8 (ADS124S08 only)", 23 REFOUT (out) "Positive voltage reference output.", 24 REFCOM (out) "Negative voltage reference output. Connect to AVSS.", 25 NC "Leave unconnected or connect to AVSS", 26 AVDD (power) "Positive analog power supply. Connect a 330-nF (or larger) capacitor to AVSS.", 27 AVSS (power) "Negative analog power supply", 28 AVSS-SW (power) "Negative analog power supply; low-side switch. Connect to AVSS.", 29 REFN0 (in) "Negative external reference input 0", 30 REFP0 (in) "Positive external reference input 0", 31 REFN1/AIN7 (in) "Negative external reference input 1; analog input 7 (ADS124S08 only)", 32 REFP1/AIN6 (in) "Positive external reference input 1; analog input 6 (ADS124S08 only)"

## ADS1115
designator Module?  (value not drawn)
ADC 16Bit 4 chanels
footprint ADS1115_1 (ADC 16bit 4Ch)
footprint ADS1115_2 (ADC 16bit 4Ch)
pins: 1 VCC, 2 GND, 3 SCL, 4 SDA, 5 ADDR, 6 ALERT, 7 A0, 8 A1, 9 A2, 10 A3

## ADUM1250
designator U?
footprint SOIC-8
pins: 1 VCC1, 2 SDA1, 3 SCL1, 4 GND1, 5 GND2, 6 SCL2, 7 SDA2, 8 VCC2

## AI7688H
designator U?
MT7688 IoT SiP Module; MFR: ACSIP; Solder: SMT; MPN: AI7688H; Value: AI7688H; Category: MODULE; PinCount: 60
footprint AI7688H
footprint AI7688H-NoAT (Footprint not found)
pins: 1 GND (in), 2 JTAG_TMS (in), 3 JTAG_TDO/GPIO_43/EPHY_LED (in), 4 JTAG_NREST (in), 5 UART_TXD1/GPIO_45 (in), 6 UART_RXD1/GPIO_46 (in), 7 I2S_SDI/GPIO_0 (in), 8 I2S_SDO/GPIO_1 (in), 9 I2S_WS/GPIO_2 (in), 10 I2S_CLK/GPIO_3 (in), 11 I2C_SCLK/GPIO_4 (in), 12 I2C_SDAT/GPIO_5 (in), 13 GND (in), 14 MDI_RP_P0/ETHY_RD+ (in), 15 MDI_RN_P0/ETHY_RD- (in), 16 MDI_TP_P0/ETHY_TD+ (in), 17 MDI_TN_P0/ETHY_TD- (in), 18 GPIO_0 (in), 19 UART_TXD0/GPIO_12 (in), 20 UART_RXD0/GPIO_13 (in), 21 USB_DP (in), 22 USB_DM (in), 23 SD_WP (in), 24 SD_CD (in), 25 SD_D1 (in), 26 SD_D0 (in), 27 SD_CLK (in), 28 SD_CMD (in), 29 SD_D3 (in), 30 SD_D2 (in), 31 GND (in), 32 UART_RXD2/GPIO_21 (in), 33 UART_TXD2/GPIO_20 (in), 34 MDI_RN_P2/GPIO_19/PWM1 (in), 35 MDI_RP_P2/GPIO_18/PWM0 (in), 36 MDI_RN_P1/GPIO_17 (in), 37 MDI_RP_P1/GPIO_16 (in), 38 MDI_TN_P1/GPIO_15 (in), 39 MDI_TP_P1/GPIO_14 (in), 40 GND (in), 41 GND (in), 42 GND (in), 43 GND (in), 44 GND (in), 45 WLED_N/WIFI_LED (in), 46 REF_CLK0/GPIO_37 (in), 47 PERST_N (in), 48 WDT_RST_N/WIFI_RESET (in), 49 PORST_N/MPU_RESET (in), 50 PCIE_TXP0 (in), 51 PCIE_TXN0 (in), 52 PCIE_RXP0 (in), 53 PCIE_RXN0 (in), 54 3V3 (in), 55 PCIE_CKN0 (in), 56 PCIE_CKP0 (in), 57 JCLK (in), 58 JTDI (in), 59 GND (in), 60 2.4G_RF (in), P1 SPI_CLK/GPIO_7 (in), P2 SPI_MOSI/GPIO_8 (in), P3 SPI_MISO/GPIO_9 (in), P4 SPI_CS1/GPIO_6 (in)

## AIMC-0603-47NJ-T
designator L?, comment 47nH/0.3A
IND-FIXED 47nH 300mA 700 mOhm 0603; MPN: AIMC-0603-47NJ-T; CompanyID: VT-01094; Solder: SMT; Value: 47nH/0.3A; Category: INDUCTOR
footprint IND-0603 (1608) (Resistor, Chip; 1.60 mm L X 0.80 mm W X 0.50 mm H body)
pins: 1, 2

## AL8843SP-13
designator U?
IC LED DRIVER RGLTR PWM 3A 8SO
footprint SO8_EPAD
pins: 1 GND, 2 GND, 3 SET, 4 NC, 5 CTRL, 6 VIN, 7 SW, 8 SW, EPAD

## ALC5616
designator U?
Solder: SMT
footprint VFQFN-32 (32-VFQFN Exposed Pad)
pins: 0 TP/DGND (power) "Analog ground", 1 JD1 (in) "First jack detection pin", 2 IN1P (in) "Single-end input for microphone 1", 3 IN2P (in) ""Positive differential input for microphone / 2 / Left channel line input"", 4 IN2N/JD2 (in) ""Negative differential input for / microphone 2 / Right channel line input / Second jack detection pin"", 5 DACREF (power) "Analog power", 6 AVDD (power) "Analog power", 7 AGND (power) "Analog ground", 8 VREF (out) "Internal reference voltage", 9 LOUTL/P (out) ""Line output type / Left channel single-end output / Positive channel differential output"", 10 LOUTR/N (out) ""Line output type / Right channel single-end output / Negative channel differential output"", 11 CPN2 "Second charge pump bucket capacitor", 12 CPP2 "Second charge pump bucket capacitor", 13 CPN1 "First charge pump bucket capacitor", 14 CPP1 "First charge pump bucket capacitor", 15 CPVDD (power) ""Analog power for headphone charge / pump"", 16 CPVPP (power) "Charge pump positive voltage output", 17 HPO_R (out) ""Headphone amplifier output / Right channel"", 18 CPVREF "Headphone reference ground", 19 CPVEE (power) "Charge pump negative voltage output", 20 HPO_L (out) ""Headphone amplifier output / Left channel"", 21 ADCDAT1 (out) "First I2S interface serial data output", 22 DACDAT1 (in) "First I2S interface serial data input", 23 LRCK1 (io) "First I2S interface synchronous signal", 24 BCLK1 (io) "First I2S interface serial bit clock", 25 MCLK (in) "I2S interface master clock input", 26 SCL (in) "I2C interface clock input", 27 SDA (io) "I2C interface serial data", 28 GPIO1/IRQ (io) ""General purpose input and output / Interrupt output"", 29 DBVDD (power) "Digital power for digital I/O buffer", 30 DCVDD (power) "Digital power for digital core.", 31 MICVDD (power) "Analog power for MICBIAS", 32 MICBIAS1 (out) "Bias voltage output for microphone"

## AMC7823IRTAT
designator U4
IC ANLG MON/CTL 12B 200K 40WQFN; Solder: SMT; MPN: AMC7823IRTAT; Value: AMC7823IRTAT; Category: IC
footprint 40-WQFN (WFN, 40-lead, Body 6x6 mm, 0.5 mm pitch,IPC High Density)
pins: 1 GALR (out), 2 DAV (out), 3 ELDAC (io), 4 ISET (in), 5 PRE (out), 6 DAC0 (out), 7 DAC1 (out), 8 DAC2 (out), 9 DAC3 (out), 10 SGND (power), 11 CH0 (in), 12 CH1 (in), 13 CH2 (in), 14 CH3 (in), 15 AGND (power), 16 AVDD (power), 17 CH4 (in), 18 CH5 (in), 19 CH6 (in), 20 CH7 (in), 21 EXT_REF (out), 22 DAC4 (out), 23 DAC5 (out), 24 DAC6 (out), 25 DAC7 (out), 26 RESET (in), 27 GPIO0 (io), 28 GPIO1 (io), 29 GPIO2 (io), 30 GPIO3 (io), 31 CONVERT, 32 SCL (in), 33 MOSI (in), 34 MISO (out), 35 SS (in), 36 BVDD (power), 37 DVDD (power), 38 DGND (power), 39 GPIO4 (io), 40 GPIO5 (io), 41 EPAD (power)

## AMCA31-2R450G-S1F-T3
designator AT?, comment BLE Antenna  MFR: Abracon LLC
RF ANT 2.4GHZ CHIP SOLDER SMD; MPN: AMCA31-2R450G-S1F-T3
footprint 3216 Antenna
pins: 1, 2

## AMCA31-2R450G-S1F-T3_1
designator AT?, comment 2.4GHz  (value not drawn)
RF ANT 2.4GHZ CHIP SOLDER SMD; MPN: AMCA31-2R450G-S1F-T3; Solder: SMT; Value: 2.4GHz
footprint AMCA31-2R450G-S1F-T3 (Footprint not found)
pins: 1 AT, 2 0

## AMS1117
designator AMS?, comment AMS1117-3.3V
Dán; Value: AMS1117-3.3V SOT223; Don_Vi: Con; Ma_Hang: MH000596; Ghi_Chu: *; Kieu_Chan: *; Chung_Loai: Dán
footprint SOT223-4N (SOT223, 4-Leads, Body 6.5x3.5mm, Pitch 2.3mm, Lead Span 7mm, IPC Medium Density)
pins: 1 GND, 2 VOUT, 3 VIN, 4 VOUT

## AMS1117_1
designator AMS?, comment AMS1117-3.3V
Dán; Value: AMS1117-3.3V SOT223; Don_Vi: Con; Ma_Hang: MH000596; Ghi_Chu: *; Kieu_Chan: *; Chung_Loai: Dán
footprint SOT223-4N (SOT223, 4-Leads, Body 6.5x3.5mm, Pitch 2.3mm, Lead Span 7mm, IPC Medium Density)
pins: 1 GND, 2 VOUT, 3 VIN, 4 VOUT

## AN7522
designator IC?
footprint DIP12SL1
pins: 1 Vcc, 2 Lout+, 3 LoutGND, 4 Lout-, 5 Standby, 6 L-IN, 7 GND, 8 R-IN, 9 Volume, 10 Rout+, 11 RoutGND, 12 Rout-

## anten
designator JP?
footprint anten
pins: 1, 2, 3, 4, 5

## anten_1
designator JP?, comment anten
footprint anten
pins: 1, 2, 3, 4, 5

## AO3400A
designator Q?
MOSFET N-CH 30V 5.7A SOT23-3L
footprint SOT23-13_2 (SOT23, 1=bottom-left, 2=top, 3=bottom-right)
pins: 1 G, 2 D, 3 S

## AO3415
designator Q?, comment 20V/4A
MOSFET P-CH 20V 4A SOT23; MPN: AO3415; MFR: Alpha & Omega Semiconductor Inc.; Solder: SMT; Value: 20V/4A
footprint SOT23_3 (SOT23, 3-Leads, Body 2,90x2,30mm, Pitch 0,95mm, IPC Medium Density)
pins: 1 G, 2 S, 3 D

## AO4828
designator Q?, comment 60V/4.5A
MOSFET 2N-CH 60V 4.5A 8-SOIC; MPN: AO4828; MFR: Alpha & Omega Semiconductor Inc.; Solder: SMT; Value: 60V/4.5A
footprint SOIC-8
part A pins: 3 S1, 4 G1, 5 D1, 6 D1
part B pins: 1 S1, 2 G1, 7 D2, 8 D2
part B text: G2; S2

## AP2112K-1.2TRG1
designator U?, comment AP2112K-1.2
Single Output LDO, 300 mA, Fixed 1.2V Output, 2 to 5.5 V Input; MPN: AP2112K-1.2TRG1; Solder: SMT; Value: AP2112K-1.2; Category: IC
footprint SOT23-5
pins: 1 IN (power) "Input supply voltage", 2 GND (power) "Ground", 3 EN (in) "Enable input", 4 NC "No connected", 5 OUT (power) "Regulated output voltage"

## AP2112K-1.8TRG1
designator U?
Single Output LDO, 300 mA, Fixed 1.8 V Output, 2 to 5.5 V Input; Solder: SMT; MPN: AP2112K-1.8TRG1; Value: AP2112K-1.8TRG1; Category: IC
footprint SOT23-5
pins: 1 IN (power) "Input supply voltage", 2 GND (power) "Ground", 3 EN (in) "Enable input", 4 NC "No connected", 5 OUT (power) "Regulated output voltage"

## AP2112K-3.3TRG1
designator U?
IC REG LDO 3.3V 0.6A SOT25; Solder: SMT; MPN: AP2112K-3.3TRG1; Value: AP2112K-3.3TRG1; Category: IC
footprint SOT23-5
pins: 1 IN (power), 2 GND (power), 3 EN (in), 5 OUT (power)

## APM4953
designator IC?, comment APM4953 4953
Dán; Ten_Linh_Kien: APM4953 4953 SOP8 P-2CH 3A 30V MOSFET; Don_Vi: Con; Ma_Hang: MH002808; Ghi_Chu: *; Kieu_Chan: *; Chung_Loai: Dán
footprint SO-8 (8-Pin Small Outline Integrated Circuit 1.27 mm Pitch, IPC Medium Density)
pins: 1 S1, 2 G1, 3 S2, 4 G2, 5 D2, 6 D2, 7 D1, 8 D1

## APM4953_1
designator IC?, comment APM4953
Dual P-Channel Enhancement Mode MOSFET
footprint SO8
pins: 1 S1, 2 G1, 3 S2, 4 G2, 5 D2, 6 D2, 7 D1, 8 D1

## APM4953_2
designator IC?, comment APM4953 4953
Dán; Ten_Linh_Kien: APM4953 4953 SOP8 P-2CH 3A 30V MOSFET; Don_Vi: Con; Ma_Hang: MH002808; Ghi_Chu: *; Kieu_Chan: *; Chung_Loai: Dán
footprint SO-8 (8-Pin Small Outline Integrated Circuit 1.27 mm Pitch, IPC Medium Density)
pins: 1 S1, 2 G1, 3 S2, 4 G2, 5 D2, 6 D2, 7 D1, 8 D1

## APM 4828
designator M?, comment AO 4828
Dán; Ten_Linh_Kien: AO4828 SOP8 MOSFET N-2CH 4.5A 60V; Ma_Hang: MH005678; Don_Vi: Con; Kieu_Chan: *; Ghi_Chu: *; Chung_Loai: Dán
footprint SO-8 (8-Pin Small Outline Integrated Circuit 1.27 mm Pitch, IPC Medium Density)
pins: 1 S1, 2 G1, 3 S2, 4 G2, 5 D2, 6 D2, 7 D1, 8 D1

## APM 4828_1
designator M?, comment AO 4828
Dán; Ten_Linh_Kien: AO4828 SOP8 MOSFET N-2CH 4.5A 60V; Ma_Hang: MH005678; Don_Vi: Con; Kieu_Chan: *; Ghi_Chu: *; Chung_Loai: Dán
footprint SO-8 (8-Pin Small Outline Integrated Circuit 1.27 mm Pitch, IPC Medium Density)
pins: 1 S1, 2 G1, 3 S2, 4 G2, 5 D2, 6 D2, 7 D1, 8 D1
